# Altium footprint library MOLEX THD.PcbLib: 71 footprints (part 2 of 5) (continued)
## MOLEX_26-62-4030 [mm] "3.96mm (.156\") Pitch KK® Solid Header, Vertical, Friction Lock, 3 Circuits Without Contact Number 2, Tin (Sn) Plating"
height 14.73
pads (2):
  round 2.4 hole 1.7: 1(-3.96,0) 3(3.96,0)
Top Overlay:
  circle w0.5: c-4.99,-2.2 r0.25
  lines w0.2: -5.864,4.087 -5.356,4.087 -5.356,1.041 -5.864,1.041 -5.864,-1.18 -4.886,-1.18 ; -5.356,3.18 -5.864,3.18 -5.864,5.102 5.864,5.102 5.864,3.18 5.356,3.18 ; -3.96,-4.265 3.96,-4.265 ; -3.96,-2.546 3.96,-2.546 ; -3.96,-2.412 3.96,-2.412 ; -3.96,-1.5 -3.96,-4.899 3.96,-4.899 3.96,-1.5 ; -3.034,-1.18 -0.926,-1.18 ; 0.926,-1.18 3.034,-1.18 ; 4.886,-1.18 5.864,-1.18 5.864,1.041 5.356,1.041 5.356,4.087 5.864,4.087
  text "1" at -4.228,1.65 h1
Mechanical 8:
  lines w0.1: -4.46,0 -3.96,0 ; -3.96,-0.5 -3.96,0 ; -3.96,0.5 -3.96,0 ; -3.46,0 -3.96,0 ; -0.5,0 0,0 ; 0,-0.5 0,0 ; 0,0.5 0,0 ; 0.5,0 0,0 ; 3.46,0 3.96,0 ; 3.96,-0.5 3.96,0 ; 3.96,0.5 3.96,0 ; 4.46,0 3.96,0
Mechanical 14:
  lines w0.1: -5.864,4.087 -5.356,4.087 -5.356,1.041 -5.864,1.041 -5.864,-1.18 5.864,-1.18 5.864,1.041 5.356,1.041 5.356,4.087 5.864,4.087 ; -5.356,3.18 -5.864,3.18 -5.864,5.102 5.864,5.102 5.864,3.18 5.356,3.18 ; -3.96,-4.265 3.96,-4.265 ; -3.96,-2.546 3.96,-2.546 ; -3.96,-2.412 3.96,-2.412 ; -3.96,-1.18 -3.96,-4.899 3.96,-4.899 3.96,-1.18 ; -4.531,-0.571 -4.531,0.571 -3.389,0.571 -3.389,-0.571 -4.531,-0.571 ; -0.571,-0.571 -0.571,0.571 0.571,0.571 0.571,-0.571 -0.571,-0.571 ; 3.389,-0.571 3.389,0.571 4.531,0.571 4.531,-0.571 3.389,-0.571
  text "1" at -4.228,1.65 h1
3D body "MOLEX_26-62-4030.stp": height 14.22, standoff -4.06, extent -5.867,-4.902 5.868,5.106

## MOLEX_39-28-1023 [mm] "4.20mm (.165\") Pitch Mini-Fit Jr. Header, Dual Row, Vertical, without Snap-in Plastic Peg PCB Lock, 2 Circuits"
height 12.8
pads (2):
  round 2.1 hole 1.4: 1(0,2.75) 2(0,-2.75)
Top Overlay:
  lines w0.2: -1.7,-4.6 -1.7,-6 1.7,-6 1.7,-4.6 ; -0.693,-3.85 -1.75,-3.85 -1.75,-1.15 ; -0.693,3.85 -1.75,3.85 -1.75,0.35 1.75,0.35 1.75,3.85 0.693,3.85 ; 0.693,-3.85 1.75,-3.85 1.75,-1.15 0.95,-0.35 -0.95,-0.35 ; -1.75,-1.15 -0.95,-0.35 ; -1.75,-1.15 -0.95,-0.35 ; -2.7,-4.3 ccw(c-2.4,-4.3) -2.4,-4.6 2.4,-4.6 ccw(c2.4,-4.3) 2.7,-4.3 2.7,-3.6 3.1,-3.264 3.1,-1.936 2.7,-1.6 2.7,4.7 ccw(c2.4,4.7) 2.4,5 -2.4,5 ccw(c-2.4,4.7) -2.7,4.7 -2.7,3.2 ccw(c-2.7,2.8) -2.7,2.4 -2.7,-4.3
  text "1" at -3.492,3.582 h1
Mechanical 8:
  lines w0.1: -1,-2.75 0,-2.75 ; -1,0 0,0 ; -1,2.75 0,2.75 ; 0,-3.75 0,-2.75 ; 0,-1.75 0,-2.75 ; 0,-1 0,0 ; 0,1 0,0 ; 0,1.75 0,2.75 ; 0,3.75 0,2.75 ; 1,-2.75 0,-2.75 ; 1,0 0,0 ; 1,2.75 0,2.75
Mechanical 14:
  lines w0.1: -1.7,-4.6 -1.7,-6 1.7,-6 1.7,-4.6 ; -1.75,-1.15 -0.95,-0.35 ; -1.75,-1.15 -1.75,-3.85 1.75,-3.85 1.75,-1.15 0.95,-0.35 -0.95,-0.35 ; -1.75,-1.15 -0.95,-0.35 ; -2.7,-4.3 ccw(c-2.4,-4.3) -2.4,-4.6 2.4,-4.6 ccw(c2.4,-4.3) 2.7,-4.3 2.7,-3.6 3.1,-3.264 3.1,-1.936 2.7,-1.6 2.7,4.7 ccw(c2.4,4.7) 2.4,5 -2.4,5 ccw(c-2.4,4.7) -2.7,4.7 -2.7,3.2 ccw(c-2.7,2.8) -2.7,2.4 -2.7,-4.3 ; -1.75,0.35 1.75,0.35 1.75,3.85 -1.75,3.85 -1.75,0.35
  text "1" at -3.492,3.582 h1
3D body "MOLEX_39-28-1023.stp": height 12.8, standoff -3.5, extent -3.1,-6 3.1,5

## MOLEX_39-28-1043 [mm] "4.20mm (.165\") Pitch Mini-Fit Jr. Header, Dual Row, Vertical, without Snap-in Plastic Peg PCB Lock, 4 Circuits"
height 12.8
pads (4):
  round 2.1 hole 1.4: 1(-2.1,2.75) 2(2.1,2.75) 3(-2.1,-2.75) 4(2.1,-2.75)
Top Overlay:
  lines w0.2: -2.793,-3.85 -3.85,-3.85 -3.85,-1.15 ; -2.793,3.85 -3.85,3.85 -3.85,0.35 -0.35,0.35 -0.35,3.85 -1.407,3.85 ; -1.7,-4.6 -1.7,-6 1.7,-6 1.7,-4.6 ; -1.407,-3.85 -0.35,-3.85 -0.35,-1.15 -1.15,-0.35 -3.05,-0.35 ; 1.407,-3.85 0.35,-3.85 0.35,-0.35 3.85,-0.35 3.85,-3.85 2.793,-3.85 ; 1.407,3.85 1.15,3.85 ; 2.793,3.85 3.05,3.85 3.85,3.05 3.85,0.35 0.35,0.35 0.35,3.05 ; -3.85,-1.15 -3.05,-0.35 ; -3.85,-1.15 -3.05,-0.35 ; 0.35,3.05 1.15,3.85 ; 0.35,3.05 1.15,3.85 ; -4.8,-4.3 ccw(c-4.5,-4.3) -4.5,-4.6 4.5,-4.6 ccw(c4.5,-4.3) 4.8,-4.3 4.8,-3.6 5.2,-3.264 5.2,-1.936 4.8,-1.6 4.8,4.7 ccw(c4.5,4.7) 4.5,5 -4.5,5 ccw(c-4.5,4.7) -4.8,4.7 -4.8,3.2 ccw(c-4.8,2.8) -4.8,2.4 -4.8,-4.3
  text "4" at 2.867,-6.2 h1
  text "1" at -5.592,3.582 h1
Mechanical 8:
  lines w0.1: -3.1,-2.75 -2.1,-2.75 ; -3.1,2.75 -2.1,2.75 ; -2.1,-3.75 -2.1,-2.75 ; -2.1,-1.75 -2.1,-2.75 ; -2.1,1.75 -2.1,2.75 ; -2.1,3.75 -2.1,2.75 ; -1.1,-2.75 -2.1,-2.75 ; -1.1,2.75 -2.1,2.75 ; -1,0 0,0 ; 0,-1 0,0 ; 0,1 0,0 ; 1,0 0,0 ; 1.1,-2.75 2.1,-2.75 ; 1.1,2.75 2.1,2.75 ; 2.1,-3.75 2.1,-2.75 ; 2.1,-1.75 2.1,-2.75 ; 2.1,1.75 2.1,2.75 ; 2.1,3.75 2.1,2.75 ; 3.1,-2.75 2.1,-2.75 ; 3.1,2.75 2.1,2.75
Mechanical 14:
  lines w0.1: -1.7,-4.6 -1.7,-6 1.7,-6 1.7,-4.6 ; -3.85,-1.15 -3.05,-0.35 ; -3.85,-1.15 -3.85,-3.85 -0.35,-3.85 -0.35,-1.15 -1.15,-0.35 -3.05,-0.35 ; -3.85,-1.15 -3.05,-0.35 ; 0.35,3.05 1.15,3.85 ; 0.35,3.05 0.35,0.35 3.85,0.35 3.85,3.05 3.05,3.85 1.15,3.85 ; 0.35,3.05 1.15,3.85 ; -4.8,-4.3 ccw(c-4.5,-4.3) -4.5,-4.6 4.5,-4.6 ccw(c4.5,-4.3) 4.8,-4.3 4.8,-3.6 5.2,-3.264 5.2,-1.936 4.8,-1.6 4.8,4.7 ccw(c4.5,4.7) 4.5,5 -4.5,5 ccw(c-4.5,4.7) -4.8,4.7 -4.8,3.2 ccw(c-4.8,2.8) -4.8,2.4 -4.8,-4.3 ; -3.85,0.35 -0.35,0.35 -0.35,3.85 -3.85,3.85 -3.85,0.35 ; 0.35,-3.85 3.85,-3.85 3.85,-0.35 0.35,-0.35 0.35,-3.85
  text "4" at 2.867,-6.2 h1
  text "1" at -5.592,3.582 h1
3D body "MOLEX_39-28-1043.stp": height 12.8, standoff -3.5, extent -5.2,-6 5.2,5

## MOLEX_39-28-1063 [mm] "4.20mm (.165\") Pitch Mini-Fit Jr. Header, Dual Row, Vertical, without Snap-in Plastic Peg PCB Lock, 6 Circuits"
height 12.8
pads (6):
  round 2.1 hole 1.4: 1(-4.2,2.75) 2(0,2.75) 3(4.2,2.75) 4(-4.2,-2.75) 5(0,-2.75) 6(4.2,-2.75)
Top Overlay:
  lines w0.2: -4.893,-3.85 -5.95,-3.85 -5.95,-1.15 -5.15,-0.35 -3.25,-0.35 -2.45,-1.15 -2.45,-3.85 -3.507,-3.85 ; -4.893,3.85 -5.95,3.85 -5.95,0.35 -2.45,0.35 -2.45,3.85 -3.507,3.85 ; -1.7,-4.6 -1.7,-6 1.7,-6 1.7,-4.6 ; -0.693,-3.85 -1.75,-3.85 -1.75,-0.35 1.75,-0.35 1.75,-3.85 0.693,-3.85 ; -0.693,3.85 -0.95,3.85 -1.75,3.05 -1.75,0.35 1.75,0.35 1.75,3.05 0.95,3.85 0.693,3.85 ; 3.507,-3.85 2.45,-3.85 2.45,-0.35 5.95,-0.35 5.95,-3.85 4.893,-3.85 ; 3.507,3.85 3.25,3.85 2.45,3.05 2.45,0.35 5.95,0.35 5.95,3.05 5.15,3.85 4.893,3.85 ; -6.9,-4.3 ccw(c-6.6,-4.3) -6.6,-4.6 6.6,-4.6 ccw(c6.6,-4.3) 6.9,-4.3 6.9,-3.6 7.3,-3.264 7.3,-1.936 6.9,-1.6 6.9,4.7 ccw(c6.6,4.7) 6.6,5 -6.6,5 ccw(c-6.6,4.7) -6.9,4.7 -6.9,3.2 ccw(c-6.9,2.8) -6.9,2.4 -6.9,-4.3
  text "1" at -7.692,3.582 h1
  text "6" at 3.967,-6.2 h1
Mechanical 8:
  lines w0.1: -5.2,-2.75 -4.2,-2.75 ; -5.2,2.75 -4.2,2.75 ; -4.2,-3.75 -4.2,-2.75 ; -4.2,-1.75 -4.2,-2.75 ; -4.2,1.75 -4.2,2.75 ; -4.2,3.75 -4.2,2.75 ; -3.2,-2.75 -4.2,-2.75 ; -3.2,2.75 -4.2,2.75 ; -1,-2.75 0,-2.75 ; -1,0 0,0 ; -1,2.75 0,2.75 ; 0,-3.75 0,-2.75 ; 0,-1.75 0,-2.75 ; 0,-1 0,0 ; 0,1 0,0 ; 0,1.75 0,2.75 ; 0,3.75 0,2.75 ; 1,-2.75 0,-2.75 ; 1,0 0,0 ; 1,2.75 0,2.75 ; 3.2,-2.75 4.2,-2.75 ; 3.2,2.75 4.2,2.75 ; 4.2,-3.75 4.2,-2.75 ; 4.2,-1.75 4.2,-2.75 ; 4.2,1.75 4.2,2.75 ; 4.2,3.75 4.2,2.75 ; 5.2,-2.75 4.2,-2.75 ; 5.2,2.75 4.2,2.75
Mechanical 14:
  lines w0.1: -1.7,-4.6 -1.7,-6 1.7,-6 1.7,-4.6 ; -6.9,-4.3 ccw(c-6.6,-4.3) -6.6,-4.6 6.6,-4.6 ccw(c6.6,-4.3) 6.9,-4.3 6.9,-3.6 7.3,-3.264 7.3,-1.936 6.9,-1.6 6.9,4.7 ccw(c6.6,4.7) 6.6,5 -6.6,5 ccw(c-6.6,4.7) -6.9,4.7 -6.9,3.2 ccw(c-6.9,2.8) -6.9,2.4 -6.9,-4.3 ; -5.95,-3.85 -5.95,-1.15 -5.15,-0.35 -3.25,-0.35 -2.45,-1.15 -2.45,-3.85 -5.95,-3.85 ; -5.95,0.35 -5.95,3.85 -2.45,3.85 -2.45,0.35 -5.95,0.35 ; -1.75,-3.85 -1.75,-0.35 1.75,-0.35 1.75,-3.85 -1.75,-3.85 ; -1.75,0.35 -1.75,3.05 -0.95,3.85 0.95,3.85 1.75,3.05 1.75,0.35 -1.75,0.35 ; 2.45,-3.85 2.45,-0.35 5.95,-0.35 5.95,-3.85 2.45,-3.85 ; 2.45,0.35 2.45,3.05 3.25,3.85 5.15,3.85 5.95,3.05 5.95,0.35 2.45,0.35
  text "1" at -7.692,3.582 h1
  text "6" at 3.967,-6.2 h1
3D body "MOLEX_39-28-1063.stp": height 12.8, standoff -3.5, extent -7.3,-6 7.3,5

## MOLEX_39-28-1083 [mm] "4.20mm (.165\") Pitch Mini-Fit Jr. Header, Dual Row, Vertical, without Snap-in Plastic Peg PCB Lock, 8 Circuits"
height 12.8
pads (8):
  round 2.1 hole 1.4: 1(-6.3,2.75) 2(-2.1,2.75) 3(2.1,2.75) 4(6.3,2.75) 5(-6.3,-2.75) 6(-2.1,-2.75) 7(2.1,-2.75) 8(6.3,-2.75)
Top Overlay:
  lines w0.2: -6.993,-3.85 -8.05,-3.85 -8.05,-1.15 -7.25,-0.35 -5.35,-0.35 -4.55,-1.15 -4.55,-3.85 -5.607,-3.85 ; -6.993,3.85 -8.05,3.85 -8.05,0.35 -4.55,0.35 -4.55,3.85 -5.607,3.85 ; -2.793,-3.85 -3.85,-3.85 -3.85,-0.35 -0.35,-0.35 -0.35,-3.85 -1.407,-3.85 ; -2.793,3.85 -3.05,3.85 -3.85,3.05 -3.85,0.35 -0.35,0.35 -0.35,3.05 -1.15,3.85 -1.407,3.85 ; -1.7,-4.6 -1.7,-6 1.7,-6 1.7,-4.6 ; 1.407,-3.85 0.35,-3.85 0.35,-0.35 3.85,-0.35 3.85,-3.85 2.793,-3.85 ; 1.407,3.85 1.15,3.85 0.35,3.05 0.35,0.35 3.85,0.35 3.85,3.05 3.05,3.85 2.793,3.85 ; 5.607,-3.85 4.55,-3.85 4.55,-1.15 5.35,-0.35 7.25,-0.35 8.05,-1.15 8.05,-3.85 6.993,-3.85 ; 5.607,3.85 4.55,3.85 4.55,0.35 8.05,0.35 8.05,3.85 6.993,3.85 ; -9,-4.3 ccw(c-8.7,-4.3) -8.7,-4.6 8.7,-4.6 ccw(c8.7,-4.3) 9,-4.3 9,-3.6 9.4,-3.264 9.4,-1.936 9,-1.6 9,4.7 ccw(c8.7,4.7) 8.7,5 -8.7,5 ccw(c-8.7,4.7) -9,4.7 -9,3.2 ccw(c-9,2.8) -9,2.4 -9,-4.3
  text "1" at -9.792,3.582 h1
  text "8" at 6.067,-6.2 h1
Mechanical 8:
  lines w0.1: -7.3,-2.75 -6.3,-2.75 ; -7.3,2.75 -6.3,2.75 ; -6.3,-3.75 -6.3,-2.75 ; -6.3,-1.75 -6.3,-2.75 ; -6.3,1.75 -6.3,2.75 ; -6.3,3.75 -6.3,2.75 ; -5.3,-2.75 -6.3,-2.75 ; -5.3,2.75 -6.3,2.75 ; -3.1,-2.75 -2.1,-2.75 ; -3.1,2.75 -2.1,2.75 ; -2.1,-3.75 -2.1,-2.75 ; -2.1,-1.75 -2.1,-2.75 ; -2.1,1.75 -2.1,2.75 ; -2.1,3.75 -2.1,2.75 ; -1.1,-2.75 -2.1,-2.75 ; -1.1,2.75 -2.1,2.75 ; -1,0 0,0 ; 0,-1 0,0 ; 0,1 0,0 ; 1,0 0,0 ; 1.1,-2.75 2.1,-2.75 ; 1.1,2.75 2.1,2.75 ; 2.1,-3.75 2.1,-2.75 ; 2.1,-1.75 2.1,-2.75 ; 2.1,1.75 2.1,2.75 ; 2.1,3.75 2.1,2.75 ; 3.1,-2.75 2.1,-2.75 ; 3.1,2.75 2.1,2.75 ; 5.3,-2.75 6.3,-2.75 ; 5.3,2.75 6.3,2.75 ; 6.3,-3.75 6.3,-2.75 ; 6.3,-1.75 6.3,-2.75 ; 6.3,1.75 6.3,2.75 ; 6.3,3.75 6.3,2.75 ; 7.3,-2.75 6.3,-2.75 ; 7.3,2.75 6.3,2.75
Mechanical 14:
  lines w0.1: -1.7,-4.6 -1.7,-6 1.7,-6 1.7,-4.6 ; -9,-4.3 ccw(c-8.7,-4.3) -8.7,-4.6 8.7,-4.6 ccw(c8.7,-4.3) 9,-4.3 9,-3.6 9.4,-3.264 9.4,-1.936 9,-1.6 9,4.7 ccw(c8.7,4.7) 8.7,5 -8.7,5 ccw(c-8.7,4.7) -9,4.7 -9,3.2 ccw(c-9,2.8) -9,2.4 -9,-4.3 ; -8.05,-3.85 -4.55,-3.85 -4.55,-1.15 -5.35,-0.35 -7.25,-0.35 -8.05,-1.15 -8.05,-3.85 ; -8.05,0.35 -4.55,0.35 -4.55,3.85 -8.05,3.85 -8.05,0.35 ; -3.85,-3.85 -0.35,-3.85 -0.35,-0.35 -3.85,-0.35 -3.85,-3.85 ; -3.85,0.35 -0.35,0.35 -0.35,3.05 -1.15,3.85 -3.05,3.85 -3.85,3.05 -3.85,0.35 ; 0.35,-3.85 3.85,-3.85 3.85,-0.35 0.35,-0.35 0.35,-3.85 ; 0.35,0.35 3.85,0.35 3.85,3.05 3.05,3.85 1.15,3.85 0.35,3.05 0.35,0.35 ; 4.55,-3.85 8.05,-3.85 8.05,-1.15 7.25,-0.35 5.35,-0.35 4.55,-1.15 4.55,-3.85 ; 4.55,0.35 8.05,0.35 8.05,3.85 4.55,3.85 4.55,0.35
  text "1" at -9.792,3.582 h1
  text "8" at 6.067,-6.2 h1
3D body "MOLEX_39-28-1083.stp": height 12.8, standoff -3.5, extent -9.4,-6 9.4,5

## MOLEX_39-28-1103 [mm] "4.20mm (.165\") Pitch Mini-Fit Jr. Header, Dual Row, Vertical, without Snap-in Plastic Peg PCB Lock, 10 Circuits"
height 13.1
pads (10):
  round 2.1 hole 1.4: 1(-8.4,2.75) 2(-4.2,2.75) 3(0,2.75) 4(4.2,2.75) 5(8.4,2.75) 6(-8.4,-2.75) 7(-4.2,-2.75) 8(0,-2.75) 9(4.2,-2.75) 10(8.4,-2.75)
Top Overlay:
  lines w0.2: -9.625,-3.7 -10.2,-3.7 -10.2,-1 -9.3,-0.1 -7.5,-0.1 -6.6,-1 -6.6,-3.7 -7.175,-3.7 ; -9.162,4.1 -10.2,4.1 -10.2,0.5 -6.6,0.5 -6.6,4.1 -7.638,4.1 ; -5.425,-3.7 -6,-3.7 -6,-0.1 -2.4,-0.1 -2.4,-3.7 -2.975,-3.7 ; -4.962,4.1 -5.1,4.1 -6,3.2 -6,0.5 -2.4,0.5 -2.4,3.2 -3.3,4.1 -3.438,4.1 ; -1.7,-4.6 -1.7,-6 1.7,-6 1.7,-4.6 ; -1.225,-3.7 -1.8,-3.7 -1.8,-0.1 1.8,-0.1 1.8,-3.7 1.225,-3.7 ; -0.762,4.1 -0.9,4.1 -1.8,3.2 -1.8,0.5 1.8,0.5 1.8,3.2 0.9,4.1 0.762,4.1 ; 2.975,-3.7 2.4,-3.7 2.4,-1 3.3,-0.1 5.1,-0.1 6,-1 6,-3.7 5.425,-3.7 ; 3.438,4.1 2.4,4.1 2.4,0.5 6,0.5 6,4.1 4.962,4.1 ; 7.175,-3.7 6.6,-3.7 6.6,-1 7.5,-0.1 9.3,-0.1 10.2,-1 10.2,-3.7 9.625,-3.7 ; 7.638,4.1 6.6,4.1 6.6,0.5 10.2,0.5 10.2,4.1 9.162,4.1 ; -11.1,-4.6 -11.1,2.4 cw(c-11.1,2.8) -11.1,3.2 -11.1,5 11.1,5 11.1,-1.39 11.5,-1.79 11.5,-2.79 11.1,-3.19 11.1,-4.6 -11.1,-4.6
  text "1" at -11.9,3.6 h1
  text "10" at 7.7,-6.1 h1
Mechanical 8:
  lines w0.1: -8.9,-2.75 -8.4,-2.75 ; -8.9,2.75 -8.4,2.75 ; -8.4,-3.25 -8.4,-2.75 ; -8.4,-2.25 -8.4,-2.75 ; -8.4,2.25 -8.4,2.75 ; -8.4,3.25 -8.4,2.75 ; -7.9,-2.75 -8.4,-2.75 ; -7.9,2.75 -8.4,2.75 ; -4.7,-2.75 -4.2,-2.75 ; -4.7,2.75 -4.2,2.75 ; -4.2,-3.25 -4.2,-2.75 ; -4.2,-2.25 -4.2,-2.75 ; -4.2,2.25 -4.2,2.75 ; -4.2,3.25 -4.2,2.75 ; -3.7,-2.75 -4.2,-2.75 ; -3.7,2.75 -4.2,2.75 ; -0.5,-2.75 0,-2.75 ; -0.5,0 0,0 ; -0.5,2.75 0,2.75 ; 0,-3.25 0,-2.75 ; 0,-2.25 0,-2.75 ; 0,-0.5 0,0 ; 0,0.5 0,0 ; 0,2.25 0,2.75 ; 0,3.25 0,2.75 ; 0.5,-2.75 0,-2.75 ; 0.5,0 0,0 ; 0.5,2.75 0,2.75 ; 3.7,-2.75 4.2,-2.75 ; 3.7,2.75 4.2,2.75 ; 4.2,-3.25 4.2,-2.75 ; 4.2,-2.25 4.2,-2.75 ; 4.2,2.25 4.2,2.75 ; 4.2,3.25 4.2,2.75 ; 4.7,-2.75 4.2,-2.75 ; 4.7,2.75 4.2,2.75 ; 7.9,-2.75 8.4,-2.75 ; 7.9,2.75 8.4,2.75 ; 8.4,-3.25 8.4,-2.75 ; 8.4,-2.25 8.4,-2.75 ; 8.4,2.25 8.4,2.75 ; 8.4,3.25 8.4,2.75 ; 8.9,-2.75 8.4,-2.75 ; 8.9,2.75 8.4,2.75
Mechanical 14:
  lines w0.1: -8.97,-2.65 -7.83,-2.65 ; -8.97,2.65 -7.83,2.65 ; -4.77,-2.65 -3.63,-2.65 ; -4.77,2.65 -3.63,2.65 ; -1.7,-4.6 -1.7,-6 1.7,-6 1.7,-4.6 ; -0.57,-2.65 0.57,-2.65 ; -0.57,2.65 0.57,2.65 ; 3.63,-2.65 4.77,-2.65 ; 3.63,2.65 4.77,2.65 ; 7.83,-2.65 8.97,-2.65 ; 7.83,2.65 8.97,2.65 ; -11.1,-4.6 -11.1,2.4 cw(c-11.1,2.8) -11.1,3.2 -11.1,5 11.1,5 11.1,-1.39 11.5,-1.79 11.5,-2.79 11.1,-3.19 11.1,-4.6 -11.1,-4.6 ; -10.2,-3.7 -10.2,-1 -9.3,-0.1 -7.5,-0.1 -6.6,-1 -6.6,-3.7 -10.2,-3.7 ; -10.2,0.5 -6.6,0.5 -6.6,4.1 -10.2,4.1 -10.2,0.5 ; -8.97,-3.05 -8.97,-1.51 -7.83,-1.51 -7.83,-3.05 -8.97,-3.05 ; -8.97,1.51 -8.97,3.05 -7.83,3.05 -7.83,1.51 -8.97,1.51 ; -6,-3.7 -6,-0.1 -2.4,-0.1 -2.4,-3.7 -6,-3.7 ; -6,0.5 -6,3.2 -5.1,4.1 -3.3,4.1 -2.4,3.2 -2.4,0.5 -6,0.5 ; -4.77,-3.05 -4.77,-1.51 -3.63,-1.51 -3.63,-3.05 -4.77,-3.05 ; -4.77,1.51 -4.77,3.05 -3.63,3.05 -3.63,1.51 -4.77,1.51 ; -1.8,-3.7 -1.8,-0.1 1.8,-0.1 1.8,-3.7 -1.8,-3.7 ; -1.8,0.5 -1.8,3.2 -0.9,4.1 0.9,4.1 1.8,3.2 1.8,0.5 -1.8,0.5 ; -0.57,-3.05 -0.57,-1.51 0.57,-1.51 0.57,-3.05 -0.57,-3.05 ; -0.57,1.51 -0.57,3.05 0.57,3.05 0.57,1.51 -0.57,1.51 ; 2.4,-3.7 2.4,-1 3.3,-0.1 5.1,-0.1 6,-1 6,-3.7 2.4,-3.7 ; 2.4,0.5 6,0.5 6,4.1 2.4,4.1 2.4,0.5 ; 3.63,-3.05 3.63,-1.51 4.77,-1.51 4.77,-3.05 3.63,-3.05 ; 3.63,1.51 4.77,1.51 4.77,3.05 3.63,3.05 3.63,1.51 ; 6.6,-3.7 6.6,-1 7.5,-0.1 9.3,-0.1 10.2,-1 10.2,-3.7 6.6,-3.7 ; 6.6,0.5 6.6,4.1 10.2,4.1 10.2,0.5 6.6,0.5 ; 7.83,-3.05 8.97,-3.05 8.97,-1.51 7.83,-1.51 7.83,-3.05 ; 7.83,1.51 7.83,3.05 8.97,3.05 8.97,1.51 7.83,1.51
  text "1" at -11.9,3.6 h1
  text "10" at 7.7,-6.1 h1
3D body "MOLEX_39-28-1103.stp": height 12.8, standoff -3.5, extent -11.5,-6 11.5,5

## MOLEX_39-28-1163 [mm] "4.20mm (.165\") Pitch Mini-Fit Jr. Header, Dual Row, Vertical, without Snap-in Plastic Peg PCB Lock, 16 Circuits"
height 13.1
pads (16):
  round 2.1 hole 1.4: 1(-14.7,2.75) 2(-10.5,2.75) 3(-6.3,2.75) 4(-2.1,2.75) 5(2.1,2.75) 6(6.3,2.75) 7(10.5,2.75) 8(14.7,2.75) 9(-14.7,-2.75) 10(-10.5,-2.75) 11(-6.3,-2.75) 12(-2.1,-2.75) 13(2.1,-2.75) 14(6.3,-2.75) 15(10.5,-2.75) 16(14.7,-2.75)
Top Overlay:
  lines w0.2: -15.925,-3.7 -16.5,-3.7 -16.5,-1 -15.6,-0.1 -13.8,-0.1 -12.9,-1 -12.9,-3.7 -13.475,-3.7 ; -15.462,4.1 -16.5,4.1 -16.5,0.5 -12.9,0.5 -12.9,4.1 -13.938,4.1 ; -11.725,-3.7 -12.3,-3.7 -12.3,-0.1 -8.7,-0.1 -8.7,-3.7 -9.275,-3.7 ; -11.262,4.1 -11.4,4.1 -12.3,3.2 -12.3,0.5 -8.7,0.5 -8.7,3.2 -9.6,4.1 -9.738,4.1 ; -7.525,-3.7 -8.1,-3.7 -8.1,-0.1 -4.5,-0.1 -4.5,-3.7 -5.075,-3.7 ; -7.062,4.1 -7.2,4.1 -8.1,3.2 -8.1,0.5 -4.5,0.5 -4.5,3.2 -5.4,4.1 -5.538,4.1 ; -3.325,-3.7 -3.9,-3.7 -3.9,-1 -3,-0.1 -1.2,-0.1 -0.3,-1 -0.3,-3.7 -0.875,-3.7 ; -2.862,4.1 -3.9,4.1 -3.9,0.5 -0.3,0.5 -0.3,4.1 -1.338,4.1 ; -1.7,-4.6 -1.7,-6 1.7,-6 1.7,-4.6 ; 0.875,-3.7 0.3,-3.7 0.3,-1 1.2,-0.1 3,-0.1 3.9,-1 3.9,-3.7 3.325,-3.7 ; 1.338,4.1 0.3,4.1 0.3,0.5 3.9,0.5 3.9,4.1 2.862,4.1 ; 5.075,-3.7 4.5,-3.7 4.5,-0.1 8.1,-0.1 8.1,-3.7 7.525,-3.7 ; 5.538,4.1 5.4,4.1 4.5,3.2 4.5,0.5 8.1,0.5 8.1,3.2 7.2,4.1 7.062,4.1 ; 9.275,-3.7 8.7,-3.7 8.7,-0.1 12.3,-0.1 12.3,-3.7 11.725,-3.7 ; 9.738,4.1 9.6,4.1 8.7,3.2 8.7,0.5 12.3,0.5 12.3,3.2 11.4,4.1 11.262,4.1 ; 13.475,-3.7 12.9,-3.7 12.9,-1 13.8,-0.1 15.6,-0.1 16.5,-1 16.5,-3.7 15.925,-3.7 ; 13.938,4.1 12.9,4.1 12.9,0.5 16.5,0.5 16.5,4.1 15.462,4.1 ; -17.4,-4.6 -17.4,2.4 cw(c-17.4,2.8) -17.4,3.2 -17.4,5 17.4,5 17.4,-1.39 17.8,-1.79 17.8,-2.79 17.4,-3.19 17.4,-4.6 -17.4,-4.6
  text "1" at -18.2,3.6 h1
  text "16" at 14.1,-6.1 h1
Mechanical 8:
  lines w0.1: -15.2,-2.75 -14.7,-2.75 ; -15.2,2.75 -14.7,2.75 ; -14.7,-3.25 -14.7,-2.75 ; -14.7,-2.25 -14.7,-2.75 ; -14.7,2.25 -14.7,2.75 ; -14.7,3.25 -14.7,2.75 ; -14.2,-2.75 -14.7,-2.75 ; -14.2,2.75 -14.7,2.75 ; -11,-2.75 -10.5,-2.75 ; -11,2.75 -10.5,2.75 ; -10.5,-3.25 -10.5,-2.75 ; -10.5,-2.25 -10.5,-2.75 ; -10.5,2.25 -10.5,2.75 ; -10.5,3.25 -10.5,2.75 ; -10,-2.75 -10.5,-2.75 ; -10,2.75 -10.5,2.75 ; -6.8,-2.75 -6.3,-2.75 ; -6.8,2.75 -6.3,2.75 ; -6.3,-3.25 -6.3,-2.75 ; -6.3,-2.25 -6.3,-2.75 ; -6.3,2.25 -6.3,2.75 ; -6.3,3.25 -6.3,2.75 ; -5.8,-2.75 -6.3,-2.75 ; -5.8,2.75 -6.3,2.75 ; -2.6,-2.75 -2.1,-2.75 ; -2.6,2.75 -2.1,2.75 ; -2.1,-3.25 -2.1,-2.75 ; -2.1,-2.25 -2.1,-2.75 ; -2.1,2.25 -2.1,2.75 ; -2.1,3.25 -2.1,2.75 ; -1.6,-2.75 -2.1,-2.75 ; -1.6,2.75 -2.1,2.75 ; -0.5,0 0,0 ; 0,-0.5 0,0 ; 0,0.5 0,0 ; 0.5,0 0,0 ; 1.6,-2.75 2.1,-2.75 ; 1.6,2.75 2.1,2.75 ; 2.1,-3.25 2.1,-2.75 ; 2.1,-2.25 2.1,-2.75 ; 2.1,2.25 2.1,2.75 ; 2.1,3.25 2.1,2.75 ; 2.6,-2.75 2.1,-2.75 ; 2.6,2.75 2.1,2.75 ; 5.8,-2.75 6.3,-2.75 ; 5.8,2.75 6.3,2.75 ; 6.3,-3.25 6.3,-2.75 ; 6.3,-2.25 6.3,-2.75 ; 6.3,2.25 6.3,2.75 ; 6.3,3.25 6.3,2.75 ; 6.8,-2.75 6.3,-2.75 ; 6.8,2.75 6.3,2.75 ; 10,-2.75 10.5,-2.75 ; 10,2.75 10.5,2.75 ; 10.5,-3.25 10.5,-2.75 ; 10.5,-2.25 10.5,-2.75 ; 10.5,2.25 10.5,2.75 ; 10.5,3.25 10.5,2.75 ; 11,-2.75 10.5,-2.75 ; 11,2.75 10.5,2.75 ; 14.2,-2.75 14.7,-2.75 ; 14.2,2.75 14.7,2.75 ; 14.7,-3.25 14.7,-2.75 ; 14.7,-2.25 14.7,-2.75 ; 14.7,2.25 14.7,2.75 ; 14.7,3.25 14.7,2.75 ; 15.2,-2.75 14.7,-2.75 ; 15.2,2.75 14.7,2.75
  text "16" at 14.075,-1.45 h1
  text "8" at 14.35,0.45 h1
  text "1" at -14.95,0.45 h1
  text "9" at -15.067,-1.45 h1
Mechanical 14:
  drawing of 173 lines, arcs and shapes, not listed
  text "1" at -18.2,3.6 h1
  text "16" at 14.1,-6.1 h1
3D body "MOLEX_39-28-1163.stp": height 12.8, standoff -3.5, extent -17.8,-6 17.8,5

## MOLEX_39-28-1183 [mm] "4.20mm (.165\") Pitch Mini-Fit Jr. Header, Dual Row, Vertical, without Snap-in Plastic Peg PCB Lock, 18 Circuits"
height 13.1
pads (18):
  round 2.1 hole 1.4: 1(-16.8,2.75) 2(-12.6,2.75) 3(-8.4,2.75) 4(-4.2,2.75) 5(0,2.75) 6(4.2,2.75) 7(8.4,2.75) 8(12.6,2.75) 9(16.8,2.75) 10(-16.8,-2.75) 11(-12.6,-2.75) 12(-8.4,-2.75) 13(-4.2,-2.75) 14(0,-2.75) 15(4.2,-2.75) 16(8.4,-2.75) 17(12.6,-2.75) 18(16.8,-2.75)
Top Overlay:
  lines w0.2: -17.828,-3.7 -18.6,-3.7 -18.6,-1 -17.7,-0.1 -15.9,-0.1 -15,-1 -15,-3.7 -15.772,-3.7 ; -17.061,4.1 -18.6,4.1 -18.6,0.5 -15,0.5 -15,4.1 -16.539,4.1 ; -13.594,-3.7 -14.4,-3.7 -14.4,-0.1 -10.8,-0.1 -10.8,-3.7 -11.606,-3.7 ; -12.861,4.1 -13.5,4.1 -14.4,3.2 -14.4,0.5 -10.8,0.5 -10.8,3.2 -11.7,4.1 -12.339,4.1 ; -9.394,-3.7 -10.2,-3.7 -10.2,-0.1 -6.6,-0.1 -6.6,-3.7 -7.406,-3.7 ; -8.661,4.1 -9.3,4.1 -10.2,3.2 -10.2,0.5 -6.6,0.5 -6.6,3.2 -7.5,4.1 -8.139,4.1 ; -5.194,-3.7 -6,-3.7 -6,-1 -5.1,-0.1 -3.3,-0.1 -2.4,-1 -2.4,-3.7 -3.206,-3.7 ; -4.461,4.1 -6,4.1 -6,0.5 -2.4,0.5 -2.4,4.1 -3.939,4.1 ; -1.7,-4.6 -1.7,-6 1.7,-6 1.7,-4.6 ; -0.994,-3.7 -1.8,-3.7 -1.8,-1 -0.9,-0.1 0.9,-0.1 1.8,-1 1.8,-3.7 0.994,-3.7 ; -0.261,4.1 -1.8,4.1 -1.8,0.5 1.8,0.5 1.8,4.1 0.261,4.1 ; 3.206,-3.7 2.4,-3.7 2.4,-0.1 6,-0.1 6,-3.7 5.194,-3.7 ; 3.939,4.1 3.3,4.1 2.4,3.2 2.4,0.5 6,0.5 6,3.2 5.1,4.1 4.461,4.1 ; 7.406,-3.7 6.6,-3.7 6.6,-0.1 10.2,-0.1 10.2,-3.7 9.394,-3.7 ; 8.139,4.1 7.5,4.1 6.6,3.2 6.6,0.5 10.2,0.5 10.2,3.2 9.3,4.1 8.661,4.1 ; 11.606,-3.7 10.8,-3.7 10.8,-1 11.7,-0.1 13.5,-0.1 14.4,-1 14.4,-3.7 13.594,-3.7 ; 12.339,4.1 10.8,4.1 10.8,0.5 14.4,0.5 14.4,4.1 12.861,4.1 ; 15.806,-3.7 15,-3.7 15,-1 15.9,-0.1 17.7,-0.1 18.6,-1 18.6,-3.7 17.794,-3.7 ; 16.539,4.1 15,4.1 15,0.5 18.6,0.5 18.6,4.1 17.061,4.1 ; -19.5,-4.6 19.5,-4.6 19.5,-3.19 19.9,-2.79 19.9,-1.79 19.5,-1.39 19.5,5 -19.5,5 -19.5,3.2 ccw(c-19.5,2.8) -19.5,2.4 -19.5,-4.6
  text "18" at 16.133,-6.068 h1
  text "1" at -20.4,3.75 h1
Mechanical 8:
  lines w0.05: -17.3,-2.75 -16.8,-2.75 ; -17.3,2.75 -16.8,2.75 ; -16.8,-3.25 -16.8,-2.75 ; -16.8,-2.25 -16.8,-2.75 ; -16.8,2.25 -16.8,2.75 ; -16.8,3.25 -16.8,2.75 ; -16.3,-2.75 -16.8,-2.75 ; -16.3,2.75 -16.8,2.75 ; -13.1,-2.75 -12.6,-2.75 ; -13.1,2.75 -12.6,2.75 ; -12.6,-3.25 -12.6,-2.75 ; -12.6,-2.25 -12.6,-2.75 ; -12.6,2.25 -12.6,2.75 ; -12.6,3.25 -12.6,2.75 ; -12.1,-2.75 -12.6,-2.75 ; -12.1,2.75 -12.6,2.75 ; -8.9,-2.75 -8.4,-2.75 ; -8.9,2.75 -8.4,2.75 ; -8.4,-3.25 -8.4,-2.75 ; -8.4,-2.25 -8.4,-2.75 ; -8.4,2.25 -8.4,2.75 ; -8.4,3.25 -8.4,2.75 ; -7.9,-2.75 -8.4,-2.75 ; -7.9,2.75 -8.4,2.75 ; -4.7,-2.75 -4.2,-2.75 ; -4.7,2.75 -4.2,2.75 ; -4.2,-3.25 -4.2,-2.75 ; -4.2,-2.25 -4.2,-2.75 ; -4.2,2.25 -4.2,2.75 ; -4.2,3.25 -4.2,2.75 ; -3.7,-2.75 -4.2,-2.75 ; -3.7,2.75 -4.2,2.75 ; -0.5,-2.75 0,-2.75 ; -0.5,0 0,0 ; -0.5,2.75 0,2.75 ; -0.354,-0.154 0,0.2 ; -0.354,0.554 0,0.2 ; 0,-3.25 0,-2.75 ; 0,-2.25 0,-2.75 ; 0,-0.5 0,0 ; 0,0.5 0,0 ; 0,2.25 0,2.75 ; 0,3.25 0,2.75 ; 0.354,-0.154 0,0.2 ; 0.354,0.554 0,0.2 ; 0.5,-2.75 0,-2.75 ; 0.5,0 0,0 ; 0.5,2.75 0,2.75 ; 3.7,-2.75 4.2,-2.75 ; 3.7,2.75 4.2,2.75 ; 4.2,-3.25 4.2,-2.75 ; 4.2,-2.25 4.2,-2.75 ; 4.2,2.25 4.2,2.75 ; 4.2,3.25 4.2,2.75 ; 4.7,-2.75 4.2,-2.75 ; 4.7,2.75 4.2,2.75 ; 7.9,-2.75 8.4,-2.75 ; 7.9,2.75 8.4,2.75 ; 8.4,-3.25 8.4,-2.75 ; 8.4,-2.25 8.4,-2.75 ; 8.4,2.25 8.4,2.75 ; 8.4,3.25 8.4,2.75 ; 8.9,-2.75 8.4,-2.75 ; 8.9,2.75 8.4,2.75 ; 12.1,-2.75 12.6,-2.75 ; 12.1,2.75 12.6,2.75 ; 12.6,-3.25 12.6,-2.75 ; 12.6,-2.25 12.6,-2.75 ; 12.6,2.25 12.6,2.75 ; 12.6,3.25 12.6,2.75 ; 13.1,-2.75 12.6,-2.75 ; 13.1,2.75 12.6,2.75 ; 16.3,-2.75 16.8,-2.75 ; 16.3,2.75 16.8,2.75 ; 16.8,-3.25 16.8,-2.75 ; 16.8,-2.25 16.8,-2.75 ; 16.8,2.25 16.8,2.75 ; 16.8,3.25 16.8,2.75 ; 17.3,-2.75 16.8,-2.75 ; 17.3,2.75 16.8,2.75
Mechanical 14:
  drawing of 193 lines, arcs and shapes, not listed
  text "18" at 16.133,-6.068 h1
  text "1" at -20.4,3.75 h1
3D body "MOLEX_39-28-1183.stp": height 12.8, standoff -3.5, extent -19.9,-6 19.9,5